# Altium footprint library Active.PcbLib: 325 footprints (part 13 of 23)
Each footprint in its own frame and in the unit in brackets; x right, y up, seen from the top. Pads: shape width x height; smd on the part's side, far side on the other; paste and mask are expansions set on the pad; w line width, h text height; cw(c..) or ccw(c..) is an arc to the next point about the centre after c.
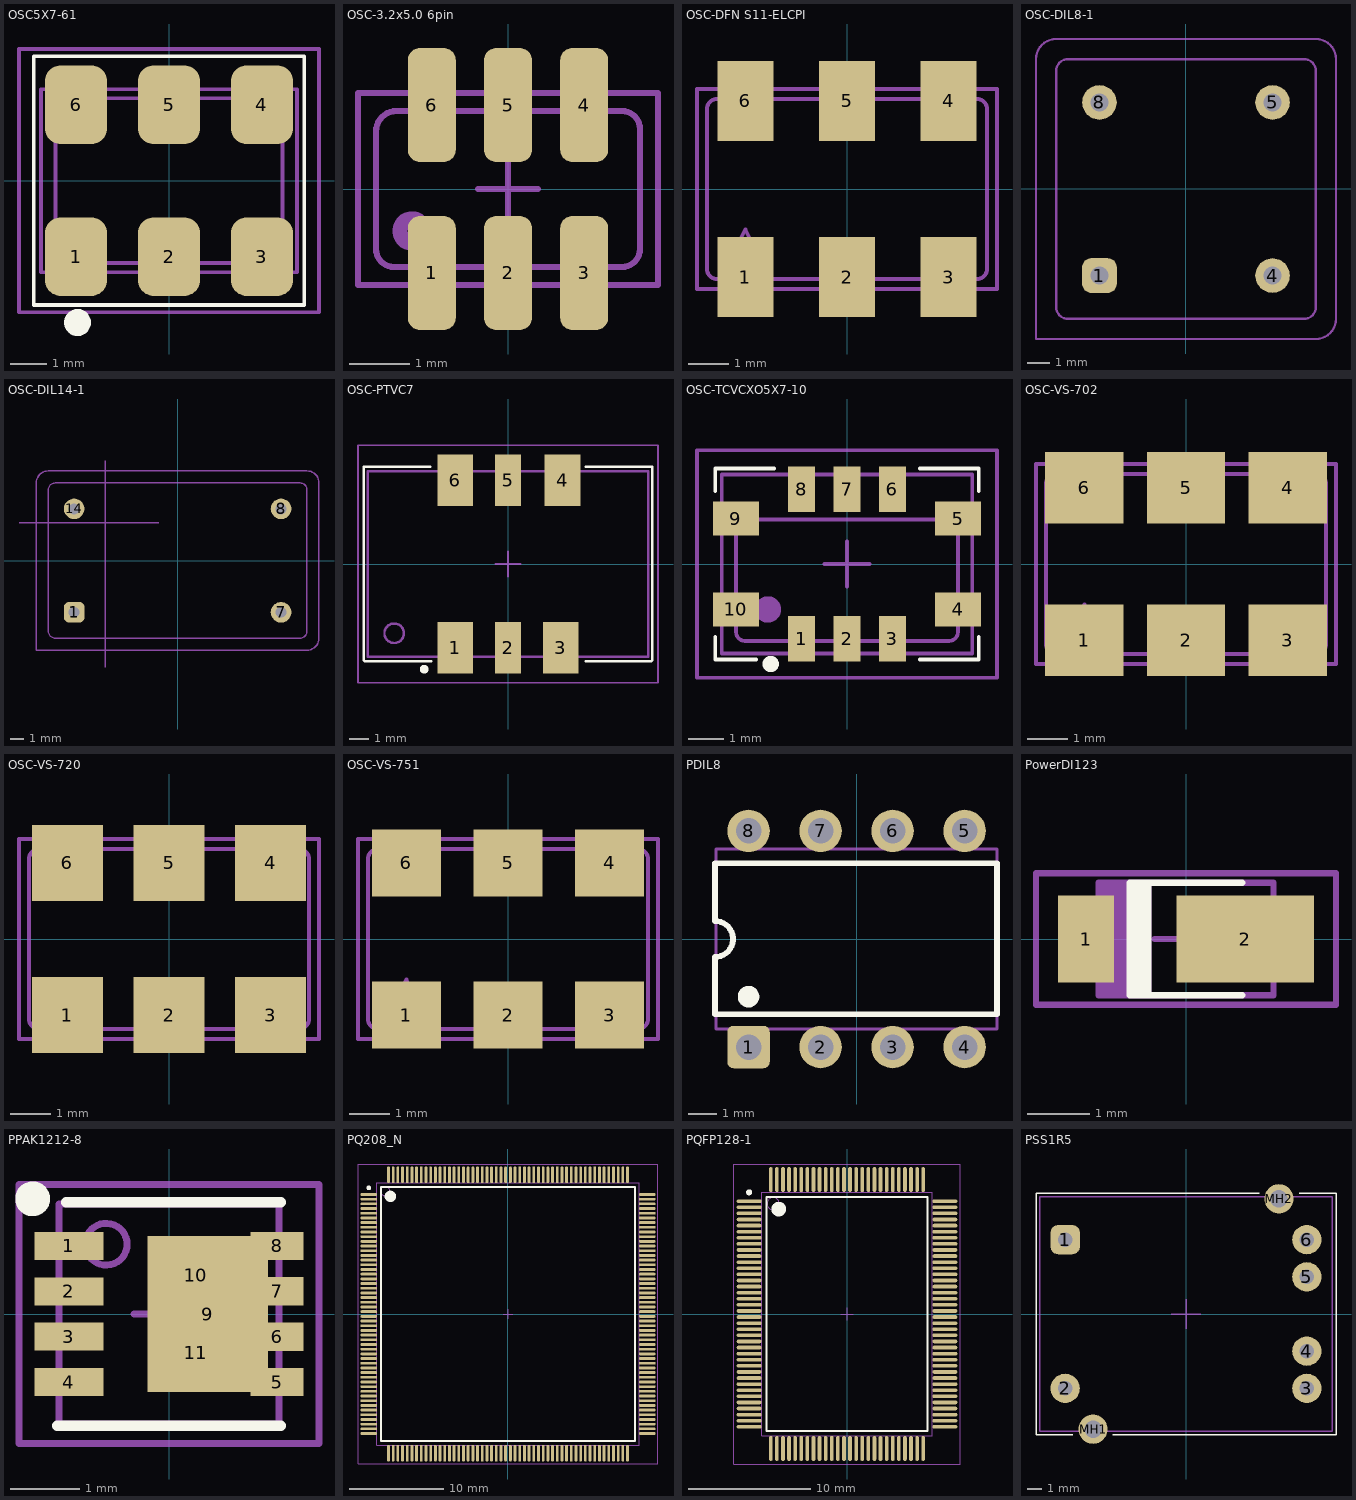
[diagram p12: the footprints below, top view; thin cyan lines are the x and y axes]

## OSC5X7-61 [mm] "Crystal oscillator 5x7x1.65mm 6pin"
height 1.65
pads (6):
  rrect50% 1.7x2.15 smd mask+0.102: 1(-2.54,-2.075) 2(0,-2.075) 3(2.54,-2.075) 4(2.54,2.075) 5(0,2.075) 6(-2.54,2.075)
Top Overlay:
  circle w0.381: c-2.5,-3.878 r0.178
  lines w0.102: -3.7,-3.4 3.7,-3.4 3.7,3.4 -3.7,3.4 -3.7,-3.4
Mechanical 13:
  circle w0.381: c-2.3,-1.5 r0.178
  lines w0.102: -3.5,-2.5 -3.5,2.5 3.5,2.5 3.5,-2.5 -3.5,-2.5 ; -3.1,-2 ccw(c-2.85,-2) -2.85,-2.25 2.85,-2.25 ccw(c2.85,-2) 3.1,-2 3.1,2 ccw(c2.85,2) 2.85,2.25 -2.85,2.25 ccw(c-2.85,2) -3.1,2 -3.1,-2
Mechanical 15:
  lines w0.102: -4.1,-3.6 -4.1,3.6 4.1,3.6 4.1,-3.6 -4.1,-3.6
3D body: height 1.67, standoff 1.65, extent -2.6,-1.8 -2,-1.2
3D body: height 1.3, standoff 0, extent -3.5,-2.5 3.5,2.5
3D body: height 1.65, standoff 1.3, extent -3.096,-2.258 3.1,2.258

## OSC-3.2x5.0 6pin [mm] "Oscillator leadless 5x3.2x1.3mm"
height 1.3
pads (6):
  rrect50% 0.8x1.9 smd: 1(-1.27,-1.4) 2(0,-1.4) 3(1.27,-1.4) 4(1.27,1.4) 5(0,1.4) 6(-1.27,1.4)
Mechanical 13:
  circle w0.254: c-1.6,-0.7 r0.2
  lines w0.102: -2.5,-1.6 -2.5,1.6 2.5,1.6 2.5,-1.6 -2.5,-1.6 ; -2.2,-1 ccw(c-1.9,-1) -1.9,-1.3 1.9,-1.3 ccw(c1.9,-1) 2.2,-1 2.2,1 ccw(c1.9,1) 1.9,1.3 -1.859,1.3 ccw(c-1.859,0.959) -2.2,0.959 -2.2,-1
Mechanical 15:
  lines w0.102: -0.5,0 0.5,0 ; 0,-0.5 0,0.5
3D body: height 1.31, standoff 1.3, extent -1.9,-1 -1.3,-0.4
3D body: height 1.3, standoff 1.1, extent -2.2,-1.3 2.2,1.3
3D body: height 1.1, standoff 0, extent -2.5,-1.6 2.5,1.6

## OSC-DFN S11-ELCPI [mm] "Oscillator ceramic 5x7.5x1.7mm"
height 1.7
pads (6):
  rect 1.4x2 smd: 1(-2.54,-2.2) 2(0,-2.2) 3(2.54,-2.2) 4(2.54,2.2) 5(0,2.2) 6(-2.54,2.2)
Mechanical 13:
  lines w0.102: -3.75,-2.5 -3.75,2.5 3.75,2.5 3.75,-2.5 -3.75,-2.5 ; -3.5,-2 ccw(c-3.25,-2) -3.25,-2.25 3.25,-2.25 ccw(c3.25,-2) 3.5,-2 3.5,2 ccw(c3.25,2) 3.25,2.25 -3.25,2.25 ccw(c-3.25,2) -3.5,2 -3.5,-2 ; -3.04,-2.016 -2.04,-2.016 -2.54,-1.016 -3.04,-2.016
3D body: height 1.6, standoff 0, extent -3.75,-2.5 3.75,2.5
3D body: height 1.7, standoff 1.6, extent -3.5,-2.25 3.5,2.25

## OSC-DIL8-1 [mil] "Oscillator dip 4pin 13.2x13.2x7.6mm"
height 314.96
pads (4):
  rrect50% 60x60 hole 31.5: 1(-150,-150)
  round 60 hole 31.5: 4(150,-150) 5(150,150) 8(-150,150)
Mechanical 13:
  lines w3.94: -260,-260 -260,225 cw(c-225,225) -225,260 225,260 cw(c225,225) 260,225 260,-225 cw(c225,-225) 225,-260 -260,-260 ; -225,-205 ccw(c-205,-205) -205,-225 205,-225 ccw(c205,-205) 225,-205 225,205 ccw(c205,205) 205,225 -205,225 ccw(c-205,205) -225,205 -225,-205
3D body: height 98.43, standoff 31.5, extent -225,-225 225,225
3D body: height 300, standoff 118.11, extent -225,-225 225,225
3D body: height 118.11, standoff 98.43, extent -260,-260 260,260
3D body: height 300.39, standoff 300, extent -165,-165 -135,-135
3D body: height 31.5, standoff 3.94, extent 100,-200 200,-100
3D body: height 31.5, standoff 3.94, extent 100,100 200,200
3D body: height 31.5, standoff 3.94, extent -200,100 -100,200

## OSC-DIL14-1 [mil] "Oscillator dip 14 4pin 20.2x13.2x7.6mm"
height 314.96
pads (4):
  rrect50% 60x60 hole 31.5: 1(-300,-150)
  round 60 hole 31.5: 7(300,-150) 8(300,150) 14(-300,150)
Mechanical 13:
  lines w3.94: -410,-260 -410,225 cw(c-375,225) -375,260 375,260 cw(c375,225) 410,225 410,-225 cw(c375,-225) 375,-260 -410,-260 ; -375,-205 ccw(c-355,-205) -355,-225 355,-225 ccw(c355,-205) 375,-205 375,205 ccw(c355,205) 355,225 -355,225 ccw(c-355,205) -375,205 -375,-205
Mechanical 15:
  lines w3.94: -460,110 -55,110 ; -210,-310 -210,290
3D body: height 360, standoff 60, extent -375,-225 375,225
3D body: height 80, standoff 0, extent -249.58,-149.83 -170,-70.17
3D body: height 80, standoff 0, extent 170,-149.83 249.58,-70.17
3D body: height 80, standoff 0, extent 170,70.17 249.58,149.83
3D body: height 60, standoff 40, extent -410,-260 410,260
3D body: height 300.39, standoff 300, extent -315,-165 -285,-135
3D body: height 80, standoff 0, extent -249.58,70.17 -170,149.83

## OSC-PTVC7 [mil] "Oscilator 14.4x9.5mm 6 pin"
height 275.59
pads (6):
  rect 72x104 smd: 1(-106.3,-169.29) 3(106.3,-169.29) 4(110.24,169.29) 6(-106.3,169.29)
  rect 52x104 smd: 2(0,-169.29) 5(0,169.29)
Top Overlay:
  circle w10: c-169.29,-212.6 r3.94
  lines w5: -157.48,196.85 -291.34,196.85 -291.34,-194.88 -289.37,-196.85 -155.51,-196.85 ; 157.48,-196.85 289.37,-196.85 291.34,-194.88 291.34,196.85 157.48,196.85
Mechanical 13:
  circle w5: c-230,-140 r19.68
  lines w5: -283.46,-187.01 283.46,-187.01 283.46,187.01 -283.46,187.01 -283.46,-187.01
Mechanical 15:
  lines w3.94: -25,0 25,0 ; 0,-25 0,25
  lines w4: -303.15,-240 303.15,-240 303.15,240 -303.15,240 -303.15,-240
3D body: height 236.22, standoff 0, extent -283.46,-187.01 283.46,187.01

## OSC-TCVCXO5X7-10 [mm] "Oscillator ceramic leadless 5x7x2mm"
height 2.5
pads (10):
  rect 0.76x1.28 smd: 1(-1.27,-2.09) 2(0,-2.09) 3(1.27,-2.09) 6(1.27,2.09) 7(0,2.09) 8(-1.27,2.09)
  rect 1.28x0.94 smd: 4(3.105,-1.27) 5(3.105,1.27) 9(-3.105,1.27) 10(-3.105,-1.27)
Top Overlay:
  circle w0.254: c-2.132,-2.794 r0.1
  lines w0.102: -3.683,-2.032 -3.683,-2.667 -2.54,-2.667 ; -3.683,2.032 -3.683,2.667 -2.032,2.667 ; 2.032,-2.667 3.683,-2.667 3.683,-2.032 ; 2.032,2.667 3.683,2.667 3.683,2.032
Mechanical 13:
  circle w0.381: c-2.21,-1.27 r0.178
  lines w0.102: -3.1,0.997 -3.1,-1.9 ccw(c-2.85,-1.9) -2.85,-2.15 2.85,-2.15 ccw(c2.85,-1.9) 3.1,-1.9 3.1,0.995 ; -3.092,0.997 cw(c-2.845,0.997) -2.845,1.245 2.845,1.245 cw(c2.845,0.995) 3.095,0.995 ; -3.5,-2.5 3.5,-2.5 3.5,2.5 -3.5,2.5 -3.5,-2.5
Mechanical 15:
  lines w0.1: -0.635,0 0.635,0 ; 0,-0.635 0,0.635
  lines w0.102: -4.191,-3.175 4.191,-3.175 4.191,3.175 -4.191,3.175 -4.191,-3.175
3D body: height 1, standoff 0, extent -3.5,-2.504 3.5,2.5
3D body: height 2, standoff 1, extent -3.1,-2.156 3.096,1.245
3D body: height 2.01, standoff 2, extent -2.54,-1.6 -1.88,-0.94

## OSC-VS-702 [mm] "Oscillator ceramic leadless 5x7.5x2mm"
height 2
pads (6):
  rect 1.96x1.78 smd mask+0.127: 1(-2.54,-1.905) 2(0,-1.905) 3(2.54,-1.905) 4(2.54,1.905) 5(0,1.905) 6(-2.54,1.905)
Mechanical 13:
  lines w0.102: -3.75,-2.5 -3.75,2.5 3.75,2.5 3.75,-2.5 -3.75,-2.5 ; -3.5,-2 ccw(c-3.25,-2) -3.25,-2.25 3.25,-2.25 ccw(c3.25,-2) 3.5,-2 3.5,2 ccw(c3.25,2) 3.25,2.25 -3.25,2.25 ccw(c-3.25,2) -3.5,2 -3.5,-2 ; -3.04,-2.016 -2.04,-2.016 -2.54,-1.016 -3.04,-2.016
3D body: height 1.8, standoff 0, extent -3.75,-2.5 3.75,2.5
3D body: height 2, standoff 1.8, extent -3.5,-2.25 3.5,2.25

## OSC-VS-720 [mm] "Oscillator ceramic leadless 5x7.5x2mm"
height 2
pads (6):
  rect 1.78x1.9 smd mask+0.254: 1(-2.54,-1.905) 2(0,-1.905) 3(2.54,-1.905) 4(2.54,1.905) 5(0,1.905) 6(-2.54,1.905)
Mechanical 13:
  lines w0.102: -3.75,-2.5 3.75,-2.5 3.75,2.5 -3.75,2.5 -3.75,-2.5 ; -3.5,-2 ccw(c-3.25,-2) -3.25,-2.25 3.25,-2.25 ccw(c3.25,-2) 3.5,-2 3.5,2 ccw(c3.25,2) 3.25,2.25 -3.25,2.25 ccw(c-3.25,2) -3.5,2 -3.5,-2 ; -3.04,-2.016 -2.54,-1.016 -2.04,-2.016 -3.04,-2.016
3D body: height 2, standoff 1.8, extent -3.5,-2.25 3.5,2.25
3D body: height 1.8, standoff 0, extent -3.75,-2.5 3.75,2.5

## OSC-VS-751 [mil] "Oscillator ceramic leadless 5x7.5x2.5mm"
height 98.43
pads (6):
  rect 68x66 smd mask+10: 1(-100,-75) 2(0,-75) 3(100,-75) 4(100,75) 5(0,75) 6(-100,75)
Mechanical 13:
  lines w4: -147.64,-98.43 147.64,-98.43 147.64,98.43 -147.64,98.43 -147.64,-98.43 ; -137.8,-78.74 ccw(c-127.95,-78.74) -127.95,-88.58 127.95,-88.58 ccw(c127.95,-78.74) 137.8,-78.74 137.8,78.74 ccw(c127.95,78.74) 127.95,88.58 -127.95,88.58 ccw(c-127.95,78.74) -137.8,78.74 -137.8,-78.74 ; -119.69,-79.37 -100,-40 -80.31,-79.37 -119.69,-79.37
3D body: height 98.43, standoff 90.55, extent -137.8,-88.58 137.8,88.58
3D body: height 90.55, standoff 0, extent -147.64,-98.43 147.64,98.43

## PDIL8 [mm] "DIP; 8 Leads; Row Spacing 7.62 mm; Pitch 2.54 mm"
height 2.5
pads (8):
  rrect30% 1.5x1.5 hole 0.9: 1(-3.81,-3.81)
  round 1.5 hole 0.9: 2(-1.27,-3.81) 3(1.27,-3.81) 4(3.81,-3.81) 5(3.81,3.81) 6(1.27,3.81) 7(-1.27,3.81) 8(-3.81,3.81)
Top Overlay:
  circle w0.4: c-3.81,-2.032 r0.18
  lines w0.2: -4.992,2.65 -4.992,0.635 cw(c-4.992,0) -4.992,-0.635 -4.992,-2.65 4.953,-2.65 4.953,2.667 -4.992,2.667
Mechanical 13:
  lines w0.1: -4.953,-0.635 ccw(c-4.953,0) -4.953,0.635 ; -4.953,-3.175 4.953,-3.175 4.953,3.175 -4.953,3.175 -4.953,-3.175
3D body: height 3.81, standoff 3.8, extent -4.191,-2.921 -2.921,-1.651
3D body: height 2.2, standoff 1.95, extent 0.508,3.175 2.032,3.683
3D body: height 2.2, standoff 0, extent 0.508,3.683 2.032,3.937
3D body: height 0, standoff -3, extent 1.016,3.683 1.524,3.937
3D body: height 2.2, standoff 1.95, extent -2.032,3.175 -0.508,3.683
3D body: height 2.2, standoff 0, extent -2.032,3.683 -0.508,3.937
3D body: height 0, standoff -3, extent -1.524,3.683 -1.016,3.937
3D body: height 2.2, standoff 1.95, extent -2.032,-3.683 -0.508,-3.175
3D body: height 2.2, standoff 0, extent -2.032,-3.937 -0.508,-3.683
3D body: height 0, standoff -3, extent -1.524,-3.937 -1.016,-3.683
3D body: height 0, standoff -3, extent 1.016,-3.937 1.524,-3.683
3D body: height 2.2, standoff 0, extent 0.508,-3.937 2.032,-3.683
3D body: height 2.2, standoff 1.95, extent 0.508,-3.683 2.032,-3.175
3D body: height 0, standoff -3, extent 3.556,-3.937 4.064,-3.683
3D body: height 2.2, standoff 0, extent 3.048,-3.937 4.064,-3.683
3D body: height 2.2, standoff 1.95, extent 3.048,-3.683 4.064,-3.175
3D body: height 0, standoff -3, extent 3.556,3.683 4.064,3.937
3D body: height 2.2, standoff 0, extent 3.048,3.683 4.064,3.937
3D body: height 2.2, standoff 1.95, extent 3.048,3.175 4.064,3.683
3D body: height 0, standoff -3, extent -4.064,3.683 -3.556,3.937
3D body: height 2.2, standoff 0, extent -4.064,3.683 -3.048,3.937
3D body: height 2.2, standoff 1.95, extent -4.064,3.175 -3.048,3.683
3D body: height 2.2, standoff 1.95, extent -4.064,-3.683 -3.048,-3.175
3D body: height 2.2, standoff 0, extent -4.064,-3.937 -3.048,-3.683
3D body: height 0, standoff -3, extent -4.064,-3.937 -3.556,-3.683
3D body: height 3.5, standoff 0.5, extent -4.953,-3.175 4.953,3.175
3D body: height 3.8, standoff 3.5, extent -4.953,-3.175 4.953,3.175

## PowerDI123 [mm] "2-Leads, Body 1,8x2,8mm (max), IPC Medium Density"
height 1
pads (2):
  rect 0.9x1.4 smd: 1(-1.6,0)
  rect 2.2x1.4 smd: 2(0.95,0)
Top Overlay:
  lines w0.102: -0.8,-0.9 -0.8,0.9 ; -0.7,-0.9 -0.7,0.9 ; -0.6,-0.9 -0.6,0.9 ; 0.9,-0.9 -0.9,-0.9 -0.9,0.9 0.9,0.9
Mechanical 13:
  rectangle: -1.4,-0.9 -0.55,0.9
  lines w0.1: -1.4,-0.9 -1.4,0.9 1.4,0.9 1.4,-0.9 -1.4,-0.9
Mechanical 15:
  lines w0.1: -0.5,0 0.5,0 ; 0,-0.5 0,0.5 ; -2.4,-1.05 -2.4,1.05 2.4,1.05 2.4,-1.05 -2.4,-1.05
3D body: height 1.36, standoff 1.35, extent -1.4,-0.9 -0.575,0.9
3D body: height 1.35, standoff 0.05, extent -1.345,-0.9 1.345,0.9

## PPAK1212-8 [mm] "QFN, 8-Leads, Body 3,2x3,2mm (max), Pitch 0,65mm, IPC Medium Density"
height 1.1
pads (11):
  rect 0.99x0.4 smd: 1(-1.435,0.975) 2(-1.435,0.325) 3(-1.435,-0.325) 4(-1.435,-0.975)
  rect 0.76x0.406 smd: 5(1.55,-0.975) 6(1.55,-0.325) 7(1.55,0.325) 8(1.55,0.975)
  rect 1.725x2.235 smd paste-2.54: 9(0.557,0)
  rect 1.016x0.813 on Top Paste: 10(0.381,0.559) 11(0.381,-0.559)
Top Overlay:
  circle w0.25: c-1.954,1.651 r0.125
  lines w0.15: -1.6,-1.6 1.6,-1.6 ; -1.473,1.6 1.6,1.6
Mechanical 13:
  circle w0.1: c-0.9,1 r0.3
  lines w0.1: -1.575,-1.575 1.575,-1.575 1.575,1.575 -1.575,1.575 -1.575,-1.575
Mechanical 15:
  lines w0.1: -0.5,0 0.5,0 ; 0,-0.5 0,0.5 ; -2.15,-1.854 2.15,-1.854 2.15,1.854 -2.15,1.854 -2.15,-1.854
3D body: height 1.11, standoff 1.1, extent -1.2,0.7 -0.6,1.3
3D body: height 1.1, standoff 0.02, extent -1.575,-1.575 1.575,1.575

## PQ208_N [mm] "208-Pin Plastic Quad Flat Pack (PQ208), IPC Medium Density"
height 4.1
pads (208):
  oval 1.8x0.3 smd mask+0.051: 1(-14.85,12.75) 2(-14.85,12.25) 3(-14.85,11.75) 4(-14.85,11.25) 5(-14.85,10.75) 6(-14.85,10.25) 7(-14.85,9.75) 8(-14.85,9.25) 9(-14.85,8.75) 10(-14.85,8.25) 11(-14.85,7.75) 12(-14.85,7.25) 13(-14.85,6.75) 14(-14.85,6.25) 15(-14.85,5.75) 16(-14.85,5.25) 17(-14.85,4.75) 18(-14.85,4.25) 19(-14.85,3.75) 20(-14.85,3.25) 21(-14.85,2.75) 22(-14.85,2.25) 23(-14.85,1.75) 24(-14.85,1.25) 25(-14.85,0.75) 26(-14.85,0.25) 27(-14.85,-0.25) 28(-14.85,-0.75) 29(-14.85,-1.25) 30(-14.85,-1.75) 31(-14.85,-2.25) 32(-14.85,-2.75) 33(-14.85,-3.25) 34(-14.85,-3.75) 35(-14.85,-4.25) 36(-14.85,-4.75) 37(-14.85,-5.25) 38(-14.85,-5.75) 39(-14.85,-6.25) 40(-14.85,-6.75) 41(-14.85,-7.25) 42(-14.85,-7.75) 43(-14.85,-8.25) 44(-14.85,-8.75) 45(-14.85,-9.25) 46(-14.85,-9.75) 47(-14.85,-10.25) 48(-14.85,-10.75) 49(-14.85,-11.25) 50(-14.85,-11.75) 51(-14.85,-12.25) 52(-14.85,-12.75) 105(14.85,-12.75) 106(14.85,-12.25) 107(14.85,-11.75) 108(14.85,-11.25) 109(14.85,-10.75) 110(14.85,-10.25) 111(14.85,-9.75) 112(14.85,-9.25) 113(14.85,-8.75) 114(14.85,-8.25) 115(14.85,-7.75) 116(14.85,-7.25) 117(14.85,-6.75) 118(14.85,-6.25) 119(14.85,-5.75) 120(14.85,-5.25) 121(14.85,-4.75) 122(14.85,-4.25) 123(14.85,-3.75) 124(14.85,-3.25) 125(14.85,-2.75) 126(14.85,-2.25) 127(14.85,-1.75) 128(14.85,-1.25) 129(14.85,-0.75) 130(14.85,-0.25) 131(14.85,0.25) 132(14.85,0.75) 133(14.85,1.25) 134(14.85,1.75) 135(14.85,2.25) 136(14.85,2.75) 137(14.85,3.25) 138(14.85,3.75) 139(14.85,4.25) 140(14.85,4.75) 141(14.85,5.25) 142(14.85,5.75) 143(14.85,6.25) 144(14.85,6.75) 145(14.85,7.25) 146(14.85,7.75) 147(14.85,8.25) 148(14.85,8.75) 149(14.85,9.25) 150(14.85,9.75) 151(14.85,10.25) 152(14.85,10.75) 153(14.85,11.25) 154(14.85,11.75) 155(14.85,12.25) 156(14.85,12.75)
  oval 0.3x1.8 smd mask+0.051: 53(-12.75,-14.85) 54(-12.25,-14.85) 55(-11.75,-14.85) 56(-11.25,-14.85) 57(-10.75,-14.85) 58(-10.25,-14.85) 59(-9.75,-14.85) 60(-9.25,-14.85) 61(-8.75,-14.85) 62(-8.25,-14.85) 63(-7.75,-14.85) 64(-7.25,-14.85) 65(-6.75,-14.85) 66(-6.25,-14.85) 67(-5.75,-14.85) 68(-5.25,-14.85) 69(-4.75,-14.85) 70(-4.25,-14.85) 71(-3.75,-14.85) 72(-3.25,-14.85) 73(-2.75,-14.85) 74(-2.25,-14.85) 75(-1.75,-14.85) 76(-1.25,-14.85) 77(-0.75,-14.85) 78(-0.25,-14.85) 79(0.25,-14.85) 80(0.75,-14.85) 81(1.25,-14.85) 82(1.75,-14.85) 83(2.25,-14.85) 84(2.75,-14.85) 85(3.25,-14.85) 86(3.75,-14.85) 87(4.25,-14.85) 88(4.75,-14.85) 89(5.25,-14.85) 90(5.75,-14.85) 91(6.25,-14.85) 92(6.75,-14.85) 93(7.25,-14.85) 94(7.75,-14.85) 95(8.25,-14.85) 96(8.75,-14.85) 97(9.25,-14.85) 98(9.75,-14.85) 99(10.25,-14.85) 100(10.75,-14.85) 101(11.25,-14.85) 102(11.75,-14.85) 103(12.25,-14.85) 104(12.75,-14.85) 157(12.75,14.85) 158(12.25,14.85) 159(11.75,14.85) 160(11.25,14.85) 161(10.75,14.85) 162(10.25,14.85) 163(9.75,14.85) 164(9.25,14.85) 165(8.75,14.85) 166(8.25,14.85) 167(7.75,14.85) 168(7.25,14.85) 169(6.75,14.85) 170(6.25,14.85) 171(5.75,14.85) 172(5.25,14.85) 173(4.75,14.85) 174(4.25,14.85) 175(3.75,14.85) 176(3.25,14.85) 177(2.75,14.85) 178(2.25,14.85) 179(1.75,14.85) 180(1.25,14.85) 181(0.75,14.85) 182(0.25,14.85) 183(-0.25,14.85) 184(-0.75,14.85) 185(-1.25,14.85) 186(-1.75,14.85) 187(-2.25,14.85) 188(-2.75,14.85) 189(-3.25,14.85) 190(-3.75,14.85) 191(-4.25,14.85) 192(-4.75,14.85) 193(-5.25,14.85) 194(-5.75,14.85) 195(-6.25,14.85) 196(-6.75,14.85) 197(-7.25,14.85) 198(-7.75,14.85) 199(-8.25,14.85) 200(-8.75,14.85) 201(-9.25,14.85) 202(-9.75,14.85) 203(-10.25,14.85) 204(-10.75,14.85) 205(-11.25,14.85) 206(-11.75,14.85) 207(-12.25,14.85) 208(-12.75,14.85)
Top Overlay:
  circle w0.6: c-12.55,12.55 r0.3
  circle w0.25: c-14.85,13.45 r0.125
  lines w0.2: -13.55,-13.55 13.55,-13.55 13.55,13.55 -13.55,13.55 -13.55,-13.55
Mechanical 13:
  circle w0.1: c-13.1,13.1 r0.5
  lines w0.1: -14,-14 14,-14 14,14 -14,14 -14,-14
Mechanical 15:
  lines w0.1: -0.5,0 0.5,0 ; 0,-0.5 0,0.5 ; -16,-16 16,-16 16,16 -16,16 -16,-16
3D body: height 4.1, standoff 0, extent -14,-14 14,14

## PQFP128-1 [mm] "PQFP, 128-Leads, Body 23,4x17,4mm (max), Pitch 0,50mm, IPC Medium Density"
height 3.4
pads (128):
  oval 2.05x0.305 smd mask+0.025: 1(-8.025,9.25) 2(-8.025,8.75) 3(-8.025,8.25) 4(-8.025,7.75) 5(-8.025,7.25) 6(-8.025,6.75) 7(-8.025,6.25) 8(-8.025,5.75) 9(-8.025,5.25) 10(-8.025,4.75) 11(-8.025,4.25) 12(-8.025,3.75) 13(-8.025,3.25) 14(-8.025,2.75) 15(-8.025,2.25) 16(-8.025,1.75) 17(-8.025,1.25) 18(-8.025,0.75) 19(-8.025,0.25) 20(-8.025,-0.25) 21(-8.025,-0.75) 22(-8.025,-1.25) 23(-8.025,-1.75) 24(-8.025,-2.25) 25(-8.025,-2.75) 26(-8.025,-3.25) 27(-8.025,-3.75) 28(-8.025,-4.25) 29(-8.025,-4.75) 30(-8.025,-5.25) 31(-8.025,-5.75) 32(-8.025,-6.25) 33(-8.025,-6.75) 34(-8.025,-7.25) 35(-8.025,-7.75) 36(-8.025,-8.25) 37(-8.025,-8.75) 38(-8.025,-9.25) 65(8.025,-9.25) 66(8.025,-8.75) 67(8.025,-8.25) 68(8.025,-7.75) 69(8.025,-7.25) 70(8.025,-6.75) 71(8.025,-6.25) 72(8.025,-5.75) 73(8.025,-5.25) 74(8.025,-4.75) 75(8.025,-4.25) 76(8.025,-3.75) 77(8.025,-3.25) 78(8.025,-2.75) 79(8.025,-2.25) 80(8.025,-1.75) 81(8.025,-1.25) 82(8.025,-0.75) 83(8.025,-0.25) 84(8.025,0.25) 85(8.025,0.75) 86(8.025,1.25) 87(8.025,1.75) 88(8.025,2.25) 89(8.025,2.75) 90(8.025,3.25) 91(8.025,3.75) 92(8.025,4.25) 93(8.025,4.75) 94(8.025,5.25) 95(8.025,5.75) 96(8.025,6.25) 97(8.025,6.75) 98(8.025,7.25) 99(8.025,7.75) 100(8.025,8.25) 101(8.025,8.75) 102(8.025,9.25)
  oval 0.305x2.05 smd mask+0.025: 39(-6.25,-11.025) 40(-5.75,-11.025) 41(-5.25,-11.025) 42(-4.75,-11.025) 43(-4.25,-11.025) 44(-3.75,-11.025) 45(-3.25,-11.025) 46(-2.75,-11.025) 47(-2.25,-11.025) 48(-1.75,-11.025) 49(-1.25,-11.025) 50(-0.75,-11.025) 51(-0.25,-11.025) 52(0.25,-11.025) 53(0.75,-11.025) 54(1.25,-11.025) 55(1.75,-11.025) 56(2.25,-11.025) 57(2.75,-11.025) 58(3.25,-11.025) 59(3.75,-11.025) 60(4.25,-11.025) 61(4.75,-11.025) 62(5.25,-11.025) 63(5.75,-11.025) 64(6.25,-11.025) 103(6.25,11.025) 104(5.75,11.025) 105(5.25,11.025) 106(4.75,11.025) 107(4.25,11.025) 108(3.75,11.025) 109(3.25,11.025) 110(2.75,11.025) 111(2.25,11.025) 112(1.75,11.025) 113(1.25,11.025) 114(0.75,11.025) 115(0.25,11.025) 116(-0.25,11.025) 117(-0.75,11.025) 118(-1.25,11.025) 119(-1.75,11.025) 120(-2.25,11.025) 121(-2.75,11.025) 122(-3.25,11.025) 123(-3.75,11.025) 124(-4.25,11.025) 125(-4.75,11.025) 126(-5.25,11.025) 127(-5.75,11.025) 128(-6.25,11.025)
Top Overlay:
  circle w0.6: c-5.6,8.6 r0.3
  circle w0.25: c-8.025,9.975 r0.125
  lines w0.15: -6.6,-9.6 6.6,-9.6 6.6,9.6 -6.6,9.6 -6.6,-9.6
Mechanical 13:
  circle w0.1: c-6.05,9.05 r0.5
  lines w0.1: -7,-10 7,-10 7,10 -7,10 -7,-10
Mechanical 15:
  lines w0.1: -0.5,0 0.5,0 ; 0,-0.5 0,0.5 ; -9.3,-12.3 9.3,-12.3 9.3,12.3 -9.3,12.3 -9.3,-12.3
3D body: height 3.41, standoff 3.4, extent -6.45,8.65 -5.653,9.448
3D body: height 3.4, standoff 0.25, extent -7,-10 7,10

## PSS1R5 [mm] "DC-DC1.5W"
height 8
pads (8):
  rrect50% 2x2 hole 1: 1(-8.255,5.08)
  round 2 hole 1: 2(-8.255,-5.08) 3(8.255,-5.08) 4(8.255,-2.54) 5(8.255,2.54) 6(8.255,5.08)
  round 2 hole 1.2: MH1(-6.35,-7.874) MH2(6.35,7.874)
Top Overlay:
  lines w0.102: -7.75,-8.25 -10.25,-8.25 -10.25,8.25 5,8.25 ; -5,-8.25 10.25,-8.25 10.25,8.25 7.75,8.25
Mechanical 13:
  lines w0.102: -10,-8 -10,8 10,8 10,-8 -10,-8
Mechanical 15:
  lines w0.102: -1,0 1,0 ; 0,-1 0,1
3D body: height 8, standoff 0, extent -10,-8 10,8